# Altium footprint library LDCN Components.PcbLib: 426 footprints (part 9 of 27)
Each footprint in its own frame and in the unit in brackets; x right, y up, seen from the top. Pads: shape width x height; smd on the part's side, far side on the other; paste and mask are expansions set on the pad; w line width, h text height; cw(c..) or ccw(c..) is an arc to the next point about the centre after c.
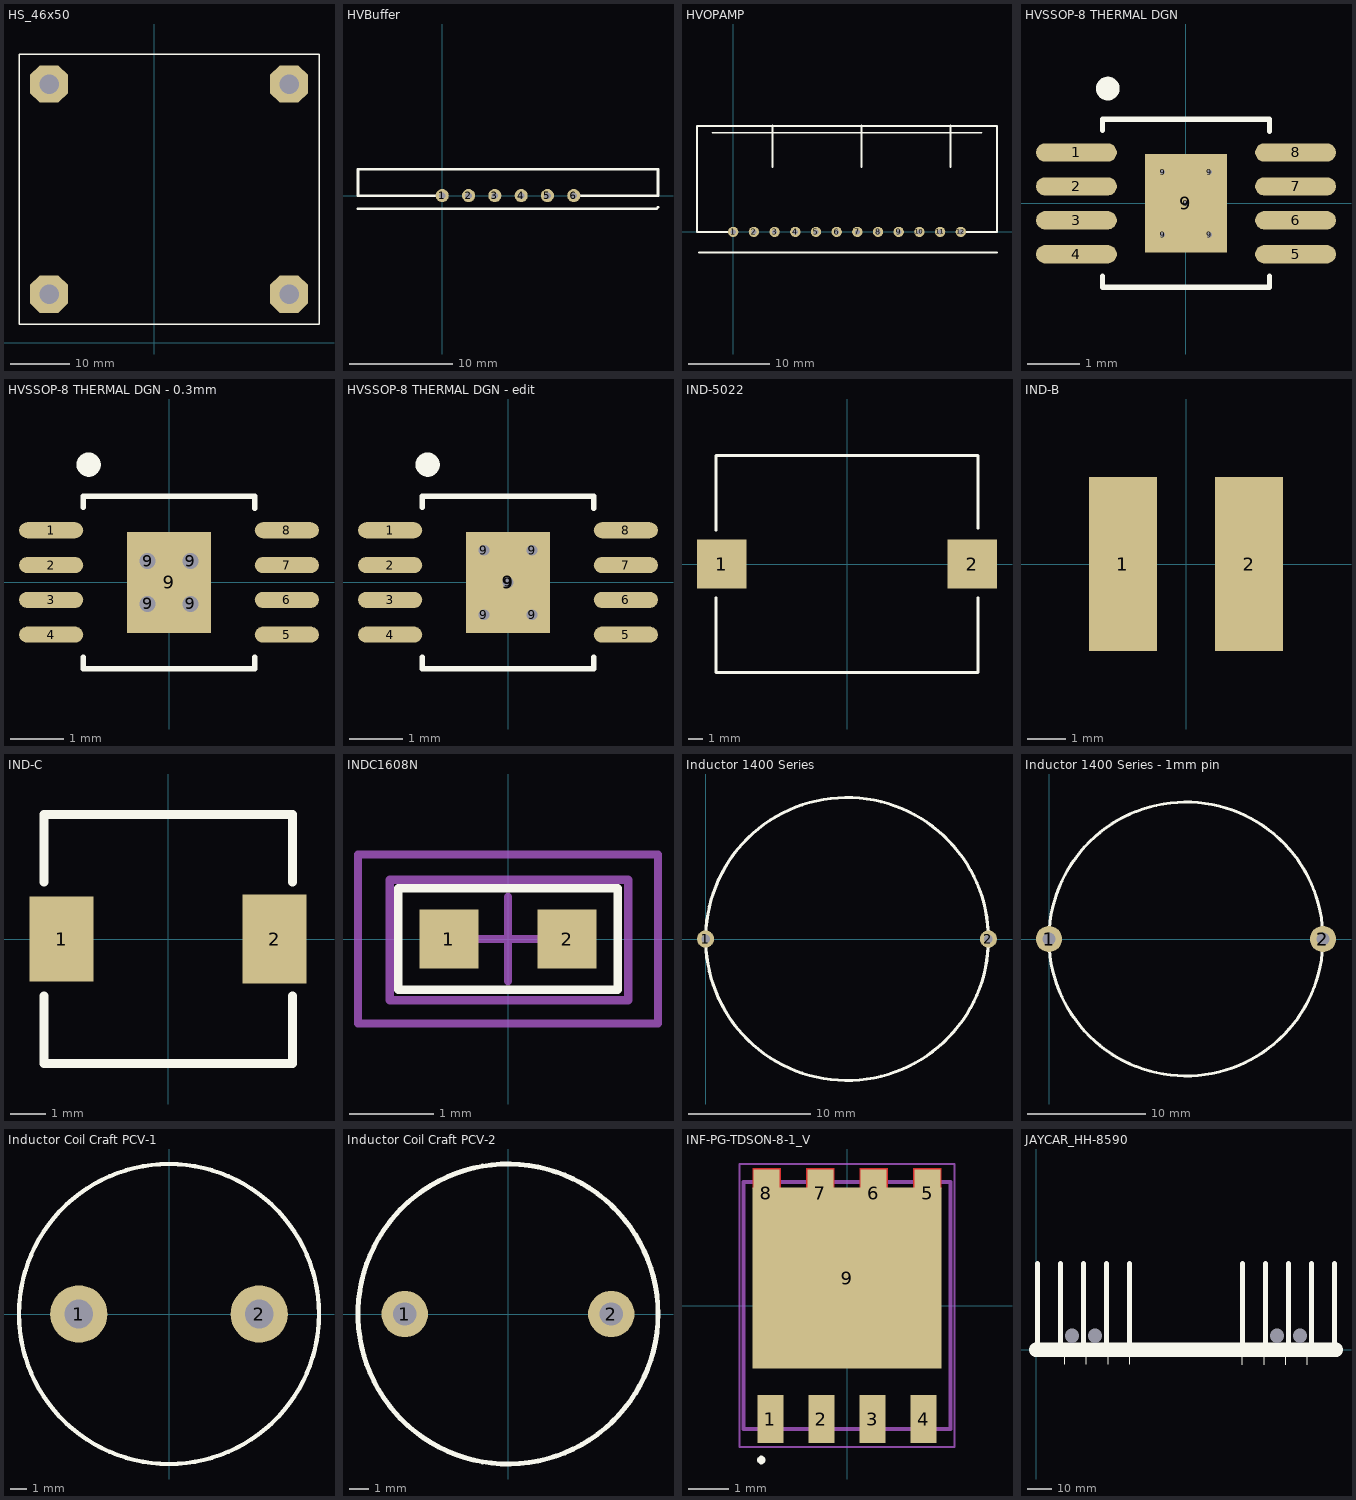
[diagram p8: the footprints below, top view; thin cyan lines are the x and y axes]

## HS_46x50 [mil]
pads (4):
  oct 250x250 hole 130: ""(-700,325) ""(-700,1725) ""(900,325) ""(900,1725)
Top Overlay:
  lines w10: -100,125 300,125 ; -900,125 -900,1925 1100,1925 1100,125 -900,125

## HVBuffer [mm]
height 40
pads (6):
  round 1.27 hole 0.635: 1(0,0) 2(2.54,0) 3(5.08,0) 4(7.62,0) 5(10.16,0) 6(12.7,0)
Top Overlay:
  lines w0.254: -8.128,-1.27 20.701,-1.27 20.828,-1.143 ; 0,0 -8.128,0 -8.128,2.54 20.828,2.54 20.828,0 12.7,0

## HVOPAMP [mm]
height 40
pads (12):
  round 1.27 hole 0.635: 1(0,0) 2(2.54,0) 3(5.08,0) 4(7.62,0) 5(10.16,0) 6(12.7,0) 7(15.24,0) 8(17.78,0) 9(20.32,0) 10(22.86,0) 11(25.4,0) 12(27.94,0)
Top Overlay:
  lines w0.2: -2.54,12.192 30.48,12.192
  lines w0.254: -4.191,-2.54 32.385,-2.54 ; 0,0 -4.445,0 -4.445,13 32.385,13 32.385,0 27.94,0 ; 4.826,8.001 4.826,13.081 ; 15.748,8.001 15.748,13.081 ; 26.67,8.001 26.67,13.081

## HVSSOP-8 THERMAL DGN [mm] "HVSSOP-8 Package Thermal Pad 3mmx3mm"
height 3
pads (14):
  oval 1.55x0.35 smd: 1(-2.1,0.975) 2(-2.1,0.325) 3(-2.1,-0.325) 4(-2.1,-0.975) 5(2.1,-0.975) 6(2.1,-0.325) 7(2.1,0.325) 8(2.1,0.975)
  round 0.2 hole 0.1: 9(-0.45,-0.6) 9(-0.45,0.6) 9(0,0) 9(0.45,-0.6) 9(0.45,0.6)
  rect 1.57x1.89 smd: 9(0,0)
Top Overlay:
  circle w0.254: c-1.5,2.2 r0.1
  lines w0.1: -1.6,-1.39 -1.6,-1.61 1.6,-1.61 1.6,-1.39 ; -1.6,1.4 -1.6,1.61 1.6,1.61 1.6,1.38
3D body: height 1.1, standoff 0, extent -1.5,-1.5 1.5,1.5

## HVSSOP-8 THERMAL DGN - 0.3mm [mm] "HVSSOP-8 Package Thermal Pad 3mmx3mm"
height 3
pads (13):
  oval 1.2x0.3 smd: 1(-2.2,0.975) 2(-2.2,0.325) 3(-2.2,-0.325) 4(-2.2,-0.975) 5(2.2,-0.975) 6(2.2,-0.325) 7(2.2,0.325) 8(2.2,0.975)
  round 0.4 hole 0.3: 9(-0.4,-0.4) 9(-0.4,0.4) 9(0.4,-0.4) 9(0.4,0.4)
  rect 1.57x1.89 smd: 9(0,0)
Top Overlay:
  circle w0.254: c-1.5,2.2 r0.1
  lines w0.1: -1.6,-1.39 -1.6,-1.61 1.6,-1.61 1.6,-1.39 ; -1.6,1.4 -1.6,1.61 1.6,1.61 1.6,1.38
3D body: height 1.1, standoff 0, extent -1.5,-1.5 1.5,1.5

## HVSSOP-8 THERMAL DGN - edit [mm] "HVSSOP-8 Package Thermal Pad 3mmx3mm"
height 3
pads (14):
  oval 1.2x0.3 smd: 1(-2.2,0.975) 2(-2.2,0.325) 3(-2.2,-0.325) 4(-2.2,-0.975) 5(2.2,-0.975) 6(2.2,-0.325) 7(2.2,0.325) 8(2.2,0.975)
  round 0.3 hole 0.2: 9(-0.45,-0.6) 9(-0.45,0.6) 9(0,0) 9(0.45,-0.6) 9(0.45,0.6)
  rect 1.57x1.89 smd: 9(0,0)
Top Overlay:
  circle w0.254: c-1.5,2.2 r0.1
  lines w0.1: -1.6,-1.39 -1.6,-1.61 1.6,-1.61 1.6,-1.39 ; -1.6,1.4 -1.6,1.61 1.6,1.61 1.6,1.38
3D body: height 1.1, standoff 0, extent -1.5,-1.5 1.5,1.5

## IND-5022 [mm]
pads (2):
  rect 3.5x3.5 smd: 1(-8.89,0) 2(8.89,0)
Top Overlay:
  lines w0.2: -9.3,-2.4 -9.3,-7.7 9.3,-7.7 9.3,-2.4 ; -9.3,2.4 -9.3,7.7 9.3,7.7 9.3,2.54

## IND-B [mm]
pads (2):
  rect 1.75x4.5 smd: 1(-1.63,0) 2(1.63,0)

## IND-C [mm]
pads (2):
  rect 1.8x2.4 smd: 1(-3,0)
  rect 1.8x2.5 smd: 2(3,0)
Top Overlay:
  lines w0.254: -3.5,-1.6 -3.5,-3.5 3.5,-3.5 3.5,-1.6 ; -3.5,1.6 -3.5,3.5 3.5,3.5 3.5,1.6

## INDC1608N [mm] "MH Series High Current Chip Ferrite Beads"
pads (2):
  rect 0.7x0.7 smd: 1(-0.7,0) 2(0.7,0)
Top Overlay:
  lines w0.1: -1.3,-0.6 1.3,-0.6 1.3,0.6 -1.3,0.6 -1.3,-0.6
Mechanical 13:
  lines w0.1: -1.4,-0.725 1.425,-0.725 1.425,0.7 -1.4,0.7 -1.4,-0.725
Mechanical 15:
  lines w0.1: -0.5,0 0.5,0 ; 0,-0.5 0,0.5 ; -1.775,-1 1.775,-1 1.775,1 -1.775,1 -1.775,-1
3D body: height 1, standoff 0, extent -0.8,-0.4 0.8,0.4

## Inductor 1400 Series [mm] "Murata 23.1mm Diameter"
height 0.025
pads (2):
  round 1.4 hole 0.7: 1(0,0) 2(23.1,0)
Top Overlay:
  circle w0.254: c11.55,0 r11.55

## Inductor 1400 Series - 1mm pin [mm] "Murata 23.1mm Diameter - 1mm pin"
height 14
pads (2):
  round 2.2 hole 1.1: 1(0,0) 2(23.1,0)
Top Overlay:
  circle w0.254: c11.55,0 r11.55

## Inductor Coil Craft PCV-1 [mm] "17mm Diamater, 10.7mm Pitch, 1.5 Diamater Wire"
height 35
pads (2):
  round 3.4 hole 1.7: 1(-5.35,0) 2(5.35,0)
Top Overlay:
  circle w0.254: c0,0 r8.9

## Inductor Coil Craft PCV-2 [mm] "15.5mm Diamater, 10.67mm Pitch, 1.07 Diamater Wire"
height 21
pads (2):
  round 2.4 hole 1.2: 1(-5.335,0) 2(5.335,0)
Top Overlay:
  circle w0.254: c0,0 r7.75

## INF-PG-TDSON-8-1_V [mm] "TDSON, 8-Leads, Body 6.15x5.15mm, Pitch 1.27mm"
height 1
pads (9):
  rect 0.65x1.2 smd: 1(-1.905,-2.825) 2(-0.635,-2.825) 3(0.635,-2.825) 4(1.905,-2.825) 5(2.007,2.794) 6(0.66,2.794) 7(-0.66,2.794) 8(-2.007,2.794)
  rect 4.7x4.5 smd: 9(0,0.686)
Top Layer:
  region: 0.315,2.925 1.015,2.925 1.015,3.425 0.315,3.425
  region: -1.015,2.925 -0.315,2.925 -0.315,3.425 -1.015,3.425
  region: 1.65,2.925 2.35,2.925 2.35,3.425 1.65,3.425
  region: -2.35,2.925 -1.65,2.925 -1.65,3.425 -2.35,3.425
Top Overlay:
  region: -2.234,-3.842 -2.234,-3.862 -2.218,-3.899 -2.19,-3.927 -2.153,-3.942 -2.134,-3.942 -2.114,-3.942 -2.077,-3.927 -2.049,-3.899 -2.034,-3.862 -2.034,-3.842 -2.034,-3.822 -2.049,-3.785 -2.077,-3.757 -2.114,-3.742 -2.134,-3.742 -2.153,-3.742 -2.19,-3.757 -2.218,-3.785 -2.234,-3.822
Mechanical 13:
  lines w0.1: -2.575,-3.075 2.575,-3.075 2.575,3.075 -2.575,3.075 -2.575,-3.075
Mechanical 15:
  lines w0.05: -2.675,-3.525 2.675,-3.525 2.675,3.525 -2.675,3.525 -2.675,-3.525
  lines w0.1: -0.5,0 0.5,0 ; 0,-0.5 0,0.5
3D body: height 1, standoff 0, extent -2.575,-3.075 2.575,3.075

## JAYCAR_HH-8590 [mm]
pads (4):
  round 1.27 hole 6: 13(15,5.9) 14(24.6,5.9) 15(100.4,5.9) 16(110,5.9)
Top Overlay:
  lines w0.4: 12,-6 12,0 ; 21,-6 21,0 ; 30,-6 30,0 ; 39,-6 39,0 ; 86,-6.2 86,-0.2 ; 95,-6.2 95,-0.2 ; 104,-6.2 104,-0.2 ; 113,-6.2 113,-0.2
  lines w2: 0.6,0 0.6,36 ; 10.2,0 10.2,36 ; 19.8,0 19.8,36 ; 29.4,0 29.4,36 ; 39,0 39,36 ; 77.8,0.2 78,0 ; 86,0 86,36 ; 95.6,0 95.6,36 ; 105.2,0 105.2,36 ; 114.8,0 114.8,36 ; 124.4,0 124.4,36
  lines w6: 0,0 125,0